# Altium footprint library Pcb-hionyPcbLib.PcbLib: 580 footprints (part 37 of 37)
Each footprint in its own frame and in the unit in brackets; x right, y up, seen from the top. Pads: shape width x height; smd on the part's side, far side on the other; paste and mask are expansions set on the pad; w line width, h text height; cw(c..) or ccw(c..) is an arc to the next point about the centre after c.
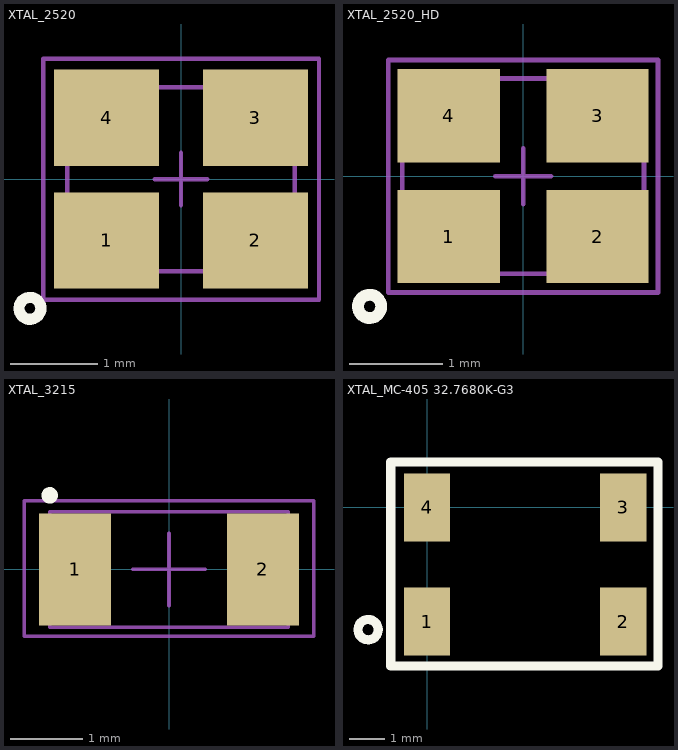
[diagram p36: the footprints below, top view; thin cyan lines are the x and y axes]

## XTAL_2520 [mm]
pads (4):
  rect 1.2x1.1 smd: 1(-0.85,-0.7) 2(0.85,-0.7) 3(0.85,0.7) 4(-0.85,0.7)
Top Overlay:
  circle w0.127: c-1.725,-1.475 r0.125
Mechanical 11:
  text ".Designator" at -0.6,-0.25 h0.5
Mechanical 13:
  lines w0.05: -1.3,-1.05 -1.3,1.05 1.3,1.05 1.3,-1.05 -1.3,-1.05
Mechanical 15:
  lines w0.05: -0.3,0 0.3,0 ; 0,-0.3 0,0.3 ; -1.575,-1.375 -1.575,1.375 1.575,1.375 1.575,-1.375 -1.575,-1.375
3D body "XTAL_2520.STEP": height 0.8, standoff 0, extent -1.25,-1 1.25,1

## XTAL_2520_HD [mm]
pads (4):
  rect 1.1x1 smd: 1(-0.8,-0.65) 2(0.8,-0.65) 3(0.8,0.65) 4(-0.8,0.65)
Top Overlay:
  circle w0.127: c-1.65,-1.4 r0.125
Mechanical 11:
  text ".Designator" at -0.6,-0.25 h0.5
Mechanical 13:
  lines w0.05: -1.3,-1.05 -1.3,1.05 1.3,1.05 1.3,-1.05 -1.3,-1.05
Mechanical 15:
  lines w0.05: -0.3,0 0.3,0 ; 0,-0.3 0,0.3 ; -1.45,-1.25 -1.45,1.25 1.45,1.25 1.45,-1.25 -1.45,-1.25
3D body: height 0.55, standoff 0, extent -1.3,-1.05 1.3,1.05

## XTAL_3215 [mm]
pads (2):
  rect 1x1.55 smd: 1(-1.3,0) 2(1.3,0)
Top Overlay:
  circle w0.127: c-1.65,1.025 r0.05
Mechanical 11:
  text ".Designator" at -0.275,0.325 h0.5
Mechanical 13:
  lines w0.05: -1.65,-0.8 -1.65,0.8 1.65,0.8 1.65,-0.8 -1.65,-0.8
Mechanical 15:
  lines w0.05: -0.5,0 0.5,0 ; 0,-0.5 0,0.5 ; -2,-0.925 -2,0.95 2,0.95 2,-0.925 -2,-0.925
3D body: height 0.9, standoff 0, extent -1.65,-0.8 1.65,0.8

## XTAL_MC-405 32.7680K-G3 [mm] "Crystal"
height 3.6
pads (4):
  rect 1.3x1.9 smd: 1(0,-3.2) 2(5.5,-3.2) 3(5.5,0) 4(0,0)
Top Overlay:
  circle w0.254: c-1.651,-3.429 r0.284
  lines w0.254: -1.016,-4.445 6.477,-4.445 6.477,1.27 -1.016,1.27 -1.016,-4.445
3D body: height 3.6, standoff 0.2, extent -1.016,-4.445 6.477,1.27